# Altium footprint library PcbLib1.PcbLib: 105 footprints (part 2 of 7)
Each footprint in its own frame and in the unit in brackets; x right, y up, seen from the top. Pads: shape width x height; smd on the part's side, far side on the other; paste and mask are expansions set on the pad; w line width, h text height; cw(c..) or ccw(c..) is an arc to the next point about the centre after c.
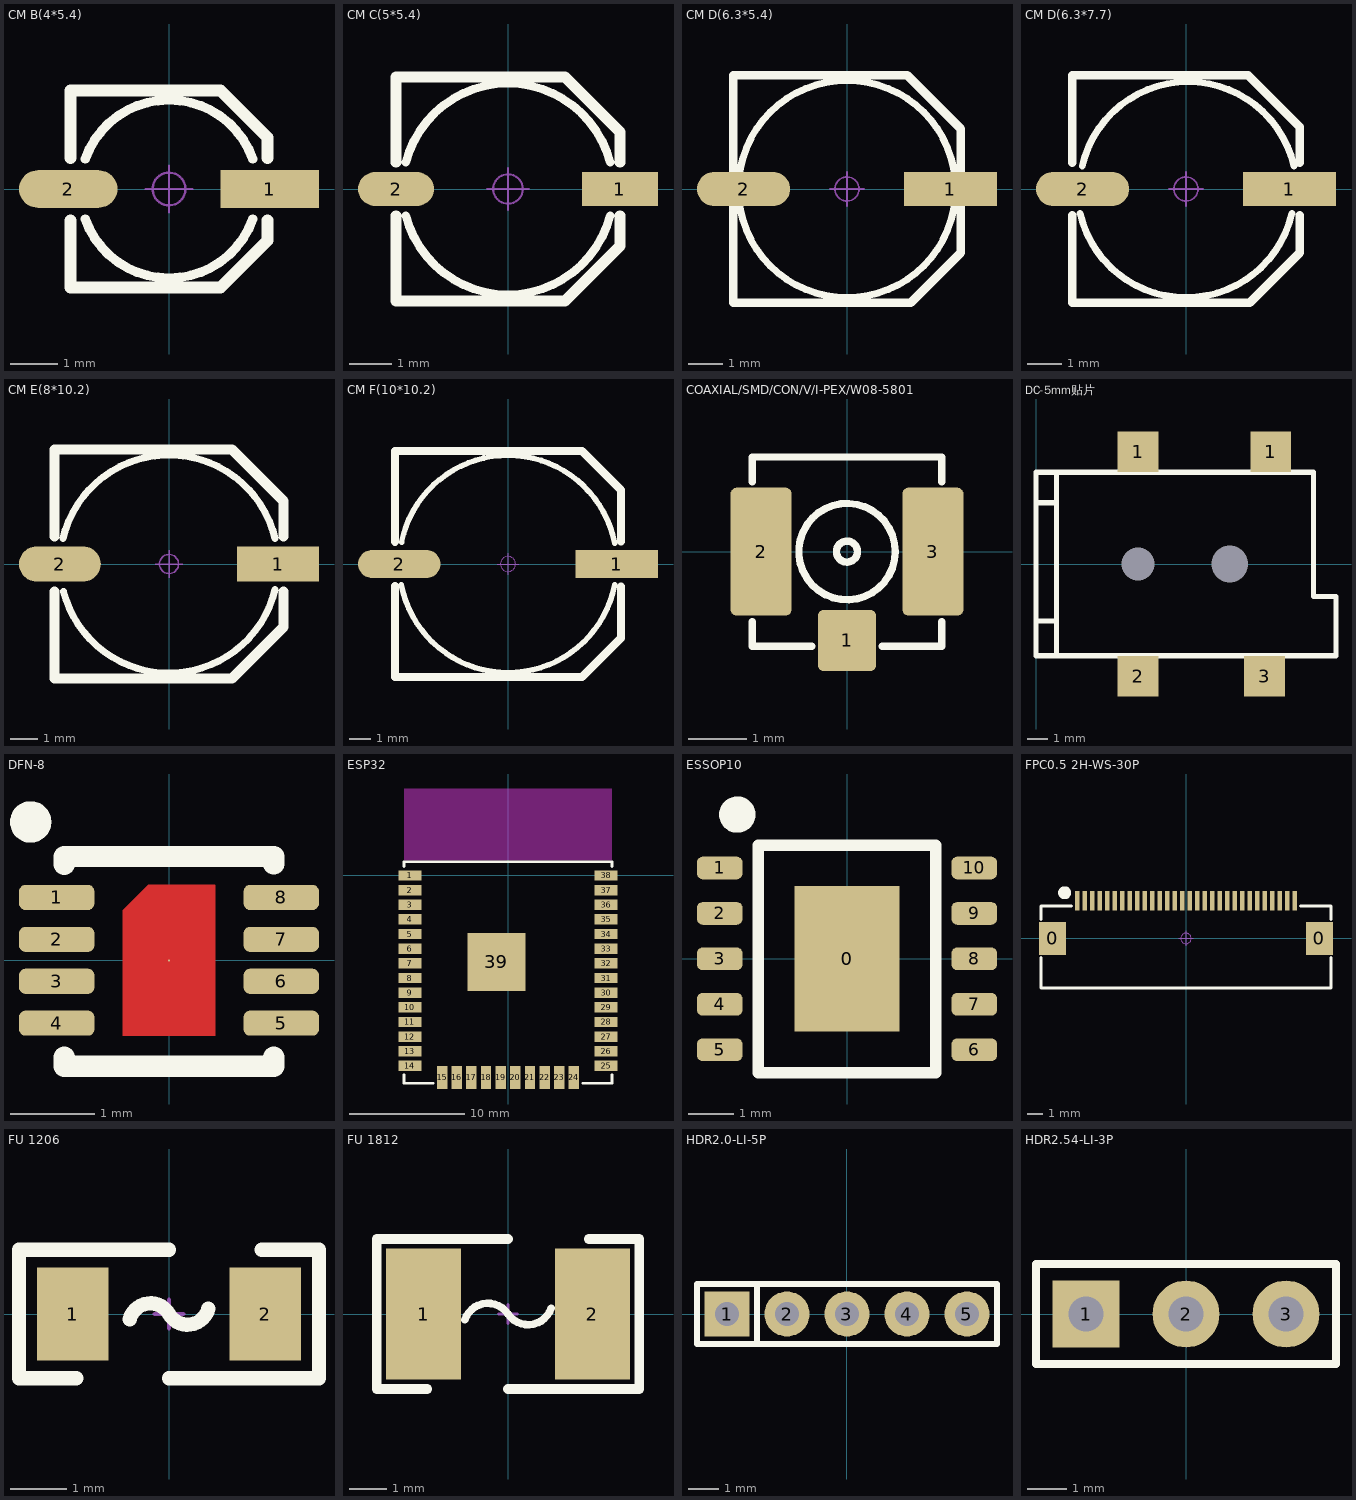
[diagram p1: the footprints below, top view; thin cyan lines are the x and y axes]

## CM B(4*5.4) [mm] "贴片电解电容，直径4mm，高5.4mm"
pads (2):
  rect 2.1x0.8 smd: 1(2.15,0)
  oval 2.1x0.8 smd: 2(-2.15,0)
Top Overlay:
  lines w0.2: -1.789,-0.639 ccw(c0,0) 1.789,-0.639 ; -1.789,0.639 cw(c0,0) 1.789,0.639
  lines w0.254: -2.1,-0.67 -2.1,-2.1 1.1,-2.1 2.1,-1.1 2.1,-0.666 ; -2.1,0.662 -2.1,2.1 1.1,2.1 2.1,1.1 2.1,0.658
Mechanical 15:
  circle w0.05: c0,0 r0.35
  lines w0.05: -0.5,0 0.5,0 ; 0,-0.5 0,0.5
3D body "CM B(4X5.4).STEP": height 5.4, standoff -0.01, extent -2.3,-2.125 2.3,2.175

## CM C(5*5.4) [mm] "贴片电解电容，直径5mm，高5.4mm            淘宝ID:黄晶宝石"
pads (2):
  rect 1.8x0.8 smd: 1(2.65,0)
  oval 1.8x0.8 smd: 2(-2.65,0)
Top Overlay:
  lines w0.2: -2.418,-0.635 ccw(c0,0) 2.418,-0.635 ; -2.418,0.635 cw(c0,0) 2.418,0.635
  lines w0.254: -2.65,-0.635 -2.65,-2.65 1.35,-2.65 2.65,-1.35 2.65,-0.635 ; -2.65,0.635 -2.65,2.65 1.35,2.65 2.65,1.35 2.65,0.635
Mechanical 15:
  circle w0.05: c0,0 r0.35
  lines w0.05: -0.5,0 0.5,0 ; 0,-0.5 0,0.5
3D body "CM C(5X5.4).STEP": height 5.4, standoff -0.01, extent -2.95,-2.65 2.95,2.65

## CM D(6.3*5.4) [mm] "贴片电解电容，直径6.3mm，高5.4mm           淘宝ID:黄晶宝石"
height 5.4
pads (2):
  rect 2.7x1 smd: 1(3,0)
  oval 2.7x1 smd: 2(-3,0)
Top Overlay:
  circle w0.2: c0,0 r3.15
  lines w0.254: -3.3,-3.3 -3.3,3.3 1.75,3.3 3.3,1.75 3.3,-1.85 1.85,-3.3 -3.3,-3.3
Mechanical 15:
  circle w0.05: c0,0 r0.35
  lines w0.05: -0.5,0 0.5,0 ; 0,-0.5 0,0.5
3D body "CM D(6.3X5.4).STEP": height 5.4, standoff -0.01, extent -3.5,-3.3 3.5,3.3

## CM D(6.3*7.7) [mm] "贴片电解电容，直径6.3mm，高7.7mm         淘宝ID:黄晶宝石"
pads (2):
  rect 2.7x1 smd: 1(3,0)
  oval 2.7x1 smd: 2(-3,0)
Top Overlay:
  lines w0.2: -3.069,-0.709 ccw(c0,0) 3.069,-0.709 ; -3.009,0.669 cw(c0.06,-0.04) 3.129,0.669
  lines w0.254: -3.3,-0.762 -3.3,-3.3 1.85,-3.3 3.3,-1.85 3.3,-0.762 ; -3.3,0.762 -3.3,3.3 1.8,3.3 3.3,1.8 3.3,0.762
Mechanical 15:
  circle w0.05: c0,0 r0.35
  lines w0.05: -0.5,0 0.5,0 ; 0,-0.5 0,0.5
3D body "CM D(6.3X7.7).STEP": height 7.7, standoff -0.01, extent -3.5,-3.3 3.5,3.3

## CM E(8*10.2) [mm] "贴片电解电容，直径8mm，高10.2mm"
pads (2):
  rect 3x1.3 smd: 1(4,0)
  oval 3x1.3 smd: 2(-4,0)
Top Overlay:
  lines w0.254: -3.888,0.939 cw(c0,0) 3.888,0.939 ; -3.873,-1 ccw(c0,0) 3.888,-0.939
  lines w0.381: -4.2,-1.016 -4.2,-4.2 2.3,-4.2 4.2,-2.3 4.2,-1.016 ; -4.2,1.016 -4.2,4.2 2.3,4.2 4.2,2.3 4.2,1.016
Mechanical 15:
  circle w0.05: c0,0 r0.35
  lines w0.05: -0.5,0 0.5,0 ; 0,-0.5 0,0.5
3D body "CM E(8X10.2).STEP": height 10.2, standoff -0.01, extent -4.5,-4.15 4.5,4.15

## CM F(10*10.2) [mm] "贴片电解电容，直径10mm，高10.2mm"
pads (2):
  rect 3.8x1.3 smd: 1(5,0)
  oval 3.8x1.3 smd: 2(-5,0)
Top Overlay:
  lines w0.254: -4.907,-0.959 ccw(c0,0) 4.907,-0.958 ; -4.897,1.011 cw(c0,0) 4.908,0.957
  lines w0.381: -5.2,-1.013 -5.2,-5.2 3.404,-5.2 5.191,-3.413 ; -5.2,1.021 -5.2,5.2 3.404,5.2 5.2,3.404 5.2,1.039 ; 5.2,-3.404 5.2,-1.031
Mechanical 15:
  circle w0.05: c0,0 r0.35
  lines w0.05: -0.5,0 0.5,0 ; 0,-0.5 0,0.5
3D body "CM F(10X10.2).STEP": height 10.2, standoff -0.01, extent -5.8,-5.15 5.8,5.15

## COAXIAL/SMD/CON/V/I-PEX/W08-5801 [mm] "https://shop463601444.taobao.com"
pads (3):
  rrect20% 1x1.05 smd: 1(0,-1.525)
  rrect20% 1.05x2.2 smd: 2(-1.475,0) 3(1.475,0)
Top Overlay:
  circle w0.127: c0,0 r0.18
  circle w0.127: c0,0 r0.828
  lines w0.127: -1.625,-1.2 -1.625,-1.625 -0.6,-1.625 ; -1.625,1.2 -1.625,1.625 1.625,1.625 1.625,1.2 ; 0.6,-1.625 1.625,-1.625 1.625,-1.2
3D body "User Library-IPEX.sldprt": height 1.25, standoff -0.01, extent -1.5,-1.55 1.5,1.55

## DC-5mm贴片 [mm]
pads (6):
  round 0 hole 1.6 unplated: 0(5,0)
  round 0 hole 1.8 unplated: 0(9.5,0)
  rect 2x2 smd: 1(5,5.5) 1(11.5,5.5) 2(5,-5.5) 3(11.2,-5.5)
Top Overlay:
  lines w0.254: 0,-2.8 1,-2.8 ; 0,3 1,3 ; 1,-4.5 1,4.5 ; 0,-4.5 14.7,-4.5 14.7,-1.6 13.6,-1.6 13.6,4.5 0,4.5 0,-4.5

## DFN-8 [mm] "2.5x2.5x0.5"
height 0.9
pads (9):
  round 0.025 smd: 0(0,0)
  rrect50% 0.9x0.3 smd: 1(-1.34,0.75) 2(-1.34,0.25) 3(-1.34,-0.25) 4(-1.34,-0.75) 5(1.34,-0.75) 6(1.34,-0.25) 7(1.34,0.25) 8(1.34,0.75)
Top Layer:
  region: -0.55,-0.9 0.55,-0.9 0.55,0.9 -0.248,0.9 -0.55,0.598
Top Overlay:
  circle w0.254: c-1.651,1.651 r0.12
  lines w0.254: -1.25,-1.156 -1.25,-1.262 1.25,-1.262 1.25,-1.156 ; -1.25,1.147 -1.25,1.237 1.25,1.239 ; 1.25,1.151 1.25,1.229
3D body "User Library-DFN8 2_5x2_5mm.sldprt": height 1.03, standoff 0.01, extent -1.26,-1.253 1.26,1.247

## ESP32 [mm]
pads (39):
  rect 2x0.9 smd: 1(-8.5,0) 2(-8.5,-1.27) 3(-8.5,-2.54) 4(-8.5,-3.81) 5(-8.5,-5.08) 6(-8.5,-6.35) 7(-8.5,-7.62) 8(-8.5,-8.89) 9(-8.5,-10.16) 10(-8.5,-11.43) 11(-8.5,-12.7) 12(-8.5,-13.97) 13(-8.5,-15.24) 14(-8.5,-16.51) 25(8.5,-16.51) 26(8.5,-15.24) 27(8.5,-13.97) 28(8.5,-12.7) 29(8.5,-11.43) 30(8.5,-10.16) 31(8.5,-8.89) 32(8.5,-7.62) 33(8.5,-6.35) 34(8.5,-5.08) 35(8.5,-3.81) 36(8.5,-2.54) 37(8.5,-1.27) 38(8.5,0)
  rect 0.9x2 smd: 15(-5.715,-17.51) 16(-4.445,-17.51) 17(-3.175,-17.51) 18(-1.905,-17.51) 19(-0.635,-17.51) 20(0.635,-17.51) 21(1.905,-17.51) 22(3.175,-17.51) 23(4.445,-17.51) 24(5.715,-17.51)
  rect 5x5 smd: 39(-1,-7.5)
Top Overlay:
  lines w0.254: -9,-17.272 -9,-18.01 -6.477,-18.01 ; -9,0.762 -9,1.19 9,1.19 9,0.762 ; 6.477,-18.01 9,-18.01 9,-17.272
Keep-Out Layer:
  region: -9,7.493 9,7.493 9,1.333 -9,1.333
3D body "ESP32-WROOM-32E_20210903_0.STEP": height 3.2, standoff 0.1, extent -9,-18.01 9,7.49

## ESSOP10 [mm] "ESSOP3.9mm"
height 1.8
pads (11):
  rect 2.3x3.2 smd: 0(0,0)
  rrect50% 1x0.5 smd: 1(-2.8,2) 2(-2.8,1) 3(-2.8,0) 4(-2.8,-1) 5(-2.8,-2) 6(2.8,-2) 7(2.8,-1) 8(2.8,0) 9(2.8,1) 10(2.8,2)
Top Overlay:
  circle w0.4: c-2.413,3.175 r0.2
  lines w0.254: -1.95,-2.5 -1.95,2.5 0,2.5 1.95,2.5 1.95,-2.5 -1.95,-2.5
3D body "User Library-ssop10.sldprt": height 1.55, standoff -0.01, extent -3,-2.45 3,2.45

## FPC0.5 2H-WS-30P [mm] "长：19.2mm，宽：5.2mm，高：2mm"
pads (32):
  rect 1.8x2.2 smd: 0(-8.9,0) 0(8.9,0)
  rect 0.3x1.3 smd: 1(-7.25,2.497) 2(-6.75,2.497) 3(-6.25,2.497) 4(-5.75,2.497) 5(-5.25,2.497) 6(-4.75,2.497) 7(-4.25,2.497) 8(-3.75,2.497) 9(-3.25,2.497) 10(-2.75,2.497) 11(-2.25,2.497) 12(-1.75,2.497) 13(-1.25,2.497) 14(-0.75,2.497) 15(-0.25,2.497) 16(0.25,2.497) 17(0.75,2.497) 18(1.25,2.497) 19(1.75,2.497) 20(2.25,2.497) 21(2.75,2.497) 22(3.25,2.497) 23(3.75,2.497) 24(4.25,2.497) 25(4.75,2.497) 26(5.25,2.497) 27(5.75,2.497) 28(6.25,2.497) 29(6.75,2.497) 30(7.25,2.497)
Top Overlay:
  circle w0.5: c-8.094,3.048 r0.18
  lines w0.2: -9.675,-1.27 -9.675,-3.302 9.675,-3.302 9.675,-1.27 ; -9.675,1.27 -9.675,2.159 -7.643,2.159 ; 7.643,2.159 9.675,2.159 9.675,1.27
Mechanical 15:
  circle w0.05: c0,0 r0.35
  lines w0.05: -0.5,0 0.5,0 ; 0,-0.5 0,0.5
3D body "FPC0.5 2H-S-W-30P.STEP": height 2, standoff -0.01, extent -9.6,-3.15 9.6,2.85

## FU 1206 [mil] "贴片保险丝"
pads (2):
  rect 50x65 smd: 1(-67.5,0) 2(67.5,0)
Top Overlay:
  lines w10: -90,45 0,45 ; -65,-45 -105,-45 -105,45 -65,45 ; -27.48,-3.62 cw(c-12.99,-7.5) 0,0 ccw(c12.99,7.5) 27.48,3.62 ; 0,-45 90,-45 ; 65,-45 105,-45 105,45 65,45
Mechanical 15:
  lines w3: -10,0 10,0 ; 0,-10 0,10
3D body "FU 01206.STEP": height 34.25, standoff 0, extent -62.99,-31.89 62.99,31.89

## FU 1812 [mm] "贴片保险丝          淘宝ID:黄晶宝石"
pads (2):
  rect 2x3.5 smd: 1(-2.25,0) 2(2.25,0)
Top Overlay:
  lines w0.203: -1.15,-0.156 cw(c-0.537,-0.362) 0,0 ccw(c0.537,0.362) 1.15,0.156
  lines w0.254: -2.159,-2 -3.5,-2 -3.5,2 0,2 ; 0,-2 3.5,-2 3.5,2 2.159,2
Mechanical 15:
  lines w0.076: -0.254,0 0.254,0 ; 0,-0.254 0,0.254
3D body "FU 01812.STEP": height 0.87, standoff 0, extent -2.3,-1.61 2.3,1.61

## HDR2.0-LI-5P [mm] "直插，脚距：2.0mm"
pads (5):
  rect 1.5x1.5 hole 0.8: 1(-4,0)
  round 1.5 hole 0.8: 2(-2,0) 3(0,0) 4(2,0) 5(4,0)
Top Overlay:
  lines w0.2: -3,-1 -3,1 ; -5,-1 5,-1 ; -5,-1 -5,1 5,1 5,-1 ; -5,-1 5,-1

## HDR2.54-LI-3P [mm] "排针，3脚"
pads (3):
  rect 1.7x1.7 hole 0.9: 1(-2.54,0)
  round 1.7 hole 0.9: 2(0,0) 3(2.54,0)
Top Overlay:
  lines w0.2: -3.81,-1.27 3.81,-1.27 3.81,1.27 -3.81,1.27 -3.81,-1.27
3D body "HDR2.54-1P.STEP": height 8.5, standoff -3, extent -3.81,-1.27 -1.27,1.27
3D body "HDR2.54-1P.STEP": height 8.5, standoff -3, extent -1.27,-1.27 1.27,1.27
3D body "HDR2.54-1P.STEP": height 8.5, standoff -3, extent 1.27,-1.27 3.81,1.27